# Altium footprint library BaseBoard.PcbLib: 128 footprints (part 5 of 8)
Each footprint in its own frame and in the unit in brackets; x right, y up, seen from the top. Pads: shape width x height; smd on the part's side, far side on the other; paste and mask are expansions set on the pad; w line width, h text height; cw(c..) or ccw(c..) is an arc to the next point about the centre after c.
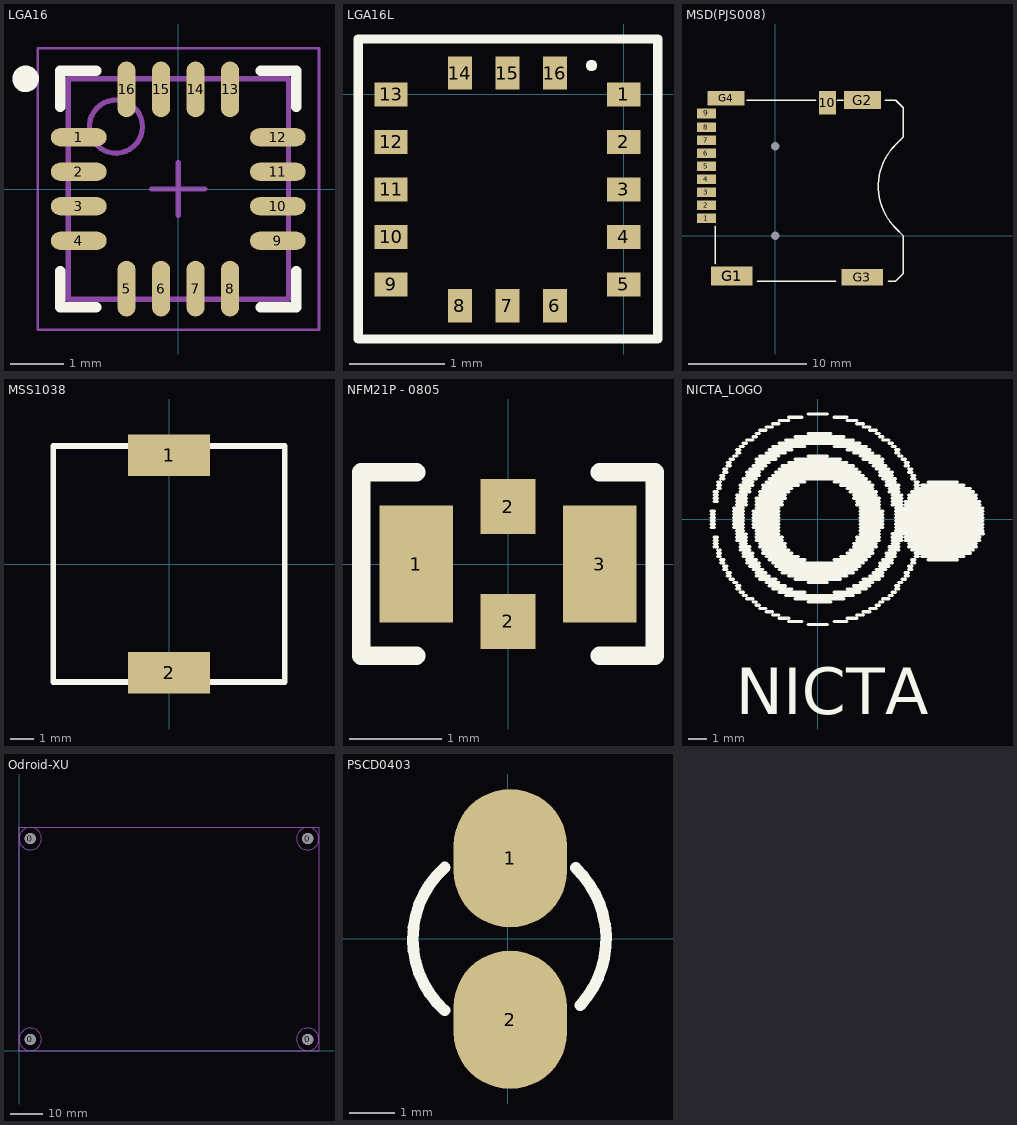
[diagram p4: the footprints below, top view; thin cyan lines are the x and y axes]

## LGA16 [mm] "QFN, 16-Leads, Body 4.00x4.00mm, Pitch 0.65mm, IPC Medium Density"
height 1
pads (16):
  oval 1.05x0.34 smd: 1(-1.875,0.975) 2(-1.875,0.325) 3(-1.875,-0.325) 4(-1.875,-0.975) 9(1.875,-0.975) 10(1.875,-0.325) 11(1.875,0.325) 12(1.875,0.975)
  oval 0.34x1.05 smd: 5(-0.975,-1.875) 6(-0.325,-1.875) 7(0.325,-1.875) 8(0.975,-1.875) 13(0.975,1.875) 14(0.325,1.875) 15(-0.325,1.875) 16(-0.975,1.875)
Top Overlay:
  circle w0.25: c-2.875,2.075 r0.125
  lines w0.2: -2.225,-1.55 -2.225,-2.225 -1.55,-2.225 ; -2.225,1.55 -2.225,2.225 -1.55,2.225 ; 1.55,-2.225 2.225,-2.225 2.225,-1.55 ; 1.55,2.225 2.225,2.225 2.225,1.55
Mechanical 13:
  circle w0.1: c-1.175,1.175 r0.5
  lines w0.1: -2.075,-2.075 2.075,-2.075 2.075,2.075 -2.075,2.075 -2.075,-2.075
Mechanical 15:
  lines w0.05: -2.65,-2.65 2.65,-2.65 2.65,2.65 -2.65,2.65 -2.65,-2.65
  lines w0.1: -0.5,0 0.5,0 ; 0,-0.5 0,0.5
3D body: height 1, standoff 0.22, extent -2.075,-2.075 2.075,2.075

## LGA16L [mm] "3x3x1.0"
pads (16):
  rect 0.35x0.25 smd: 1(0,0) 2(0,-0.5) 3(0,-1) 4(0,-1.5) 5(0,-2) 9(-2.45,-2) 10(-2.45,-1.5) 11(-2.45,-1) 12(-2.45,-0.5) 13(-2.45,0)
  rect 0.25x0.35 smd: 6(-0.725,-2.225) 7(-1.225,-2.225) 8(-1.725,-2.225) 14(-1.725,0.225) 15(-1.225,0.225) 16(-0.725,0.225)
Top Overlay:
  circle w0.1: c-0.34,0.305 r0.01
  lines w0.1: -2.794,-2.575 -2.794,0.584 0.356,0.584 0.356,-2.575 -2.794,-2.575

## MSD(PJS008) [mm]
pads (16):
  round 0.6 hole 0.7: 0(0,0) 0(0,7.55)
  rect 1.6x0.8 smd: 1(-5.8,1.475) 2(-5.8,2.575) 3(-5.8,3.675) 4(-5.8,4.775) 5(-5.8,5.875) 6(-5.8,6.975) 7(-5.8,8.075) 8(-5.8,9.175)
  rect 1.6x0.85 smd: 9(-5.8,10.325)
  rect 1.4x1.95 smd: 10(4.4,11.225)
  rect 3.5x1.6 smd: G1(-3.65,-3.4)
  rect 3.1x1.5 smd: G2(7.35,11.45)
  rect 3.5x1.4 smd: G3(7.35,-3.5)
  rect 3.1x1.2 smd: G4(-4.15,11.6)
Top Overlay:
  lines w0.127: -5.075,-2.35 -5.075,-1.925 -5.075,0.8 ; -2.413,11.43 3.429,11.43 ; -1.524,-3.81 5.08,-3.81 ; 5.207,11.43 5.715,11.43 ; 9.271,11.43 10.16,11.43 10.795,10.795 10.795,8.341 10.16,7.706 ccw(c13.696,4.171) 10.16,0.635 10.8,-0.005 10.8,-2.535 10.795,-2.54 10.795,-3.175 10.16,-3.81 9.525,-3.81

## MSS1038 [mm]
pads (2):
  rect 3.56x1.78 smd: 1(0,4.7) 2(0,-4.7)
Top Overlay:
  lines w0.254: -5,-5.1 5,-5.1 5,5.1 -5,5.1 -5,-5.1

## NFM21P - 0805 [mm] "body2.0mm * 1.2mm"
pads (4):
  rect 0.8x1.27 smd: 1(-1,0) 3(1,0)
  rect 0.6x0.6 smd: 2(0,-0.625) 2(0,0.625)
Top Overlay:
  lines w0.2: -1,-1 -1.6,-1 -1.6,1 -1,1 ; 1,-1 1.6,-1 1.6,1 1,1

## NICTA_LOGO [mm] "nicta logo"
Top Overlay:
  drawing of 285 lines, arcs and shapes, not listed
  text "NICTA" at -4.49,-10.673 h2.54

## Odroid-XU [mm] "Odroid-XU PCB"
pads (4):
  round 3.5 hole 3.5: 0(3.55,3.55) 0(3.55,66.45) 0(90.45,3.55) 0(90.45,66.45)
Mechanical 13:
  circle w0.254: c3.55,3.55 r3.5
  circle w0.254: c3.55,66.45 r3.5
  circle w0.254: c90.45,66.45 r3.5
  circle w0.254: c90.45,3.55 r3.5
  lines w0.254: 0,0 0,70 94,70 94,0 0,0
3D body: height 20, standoff 0, extent 0.051,62.951 7.049,69.949
3D body: height 20, standoff 0, extent 86.951,62.951 93.949,69.949
3D body: height 20, standoff 0, extent 86.951,0.051 93.949,7.049
3D body: height 20, standoff 0, extent 0.051,0.051 7.049,7.049
3D body: height -20.5, standoff -22, extent 0.001,0.001 93.999,69.999

## PCBComponent_1 - duplicate2 [mm]

## PCBComponent_1 - duplicate3 [mm]

## PCBComponent_1 - duplicate5 [mm]

## PCBComponent_1 - duplicate6 [mm]

## PCBComponent_1 - duplicate7 [mm]

## PCBComponent_1 - duplicate8 [mm]

## PCBComponent_1 - duplicate9 [mm]

## PCBComponent_1 - duplicate10 [mm]

## PSCD0403 [mil]
pads (2):
  oval 98.42x120 smd: 1(2,70) 2(2,-70)
Top Overlay:
  lines w10: -55.01,-61.91 cw(c1,0) -54.96,61.96 ; 58.57,61.6 cw(c0,0) 62.66,-57.44